# Altium footprint library Wurth_Elektronik_Electromechanic_Wire_to_Board_Connectors_rev16a.PCBLIB: 662 footprints (part 28 of 42)
Each footprint in its own frame and in the unit in brackets; x right, y up, seen from the top. Pads: shape width x height; smd on the part's side, far side on the other; paste and mask are expansions set on the pad; w line width, h text height; cw(c..) or ccw(c..) is an arc to the next point about the centre after c.
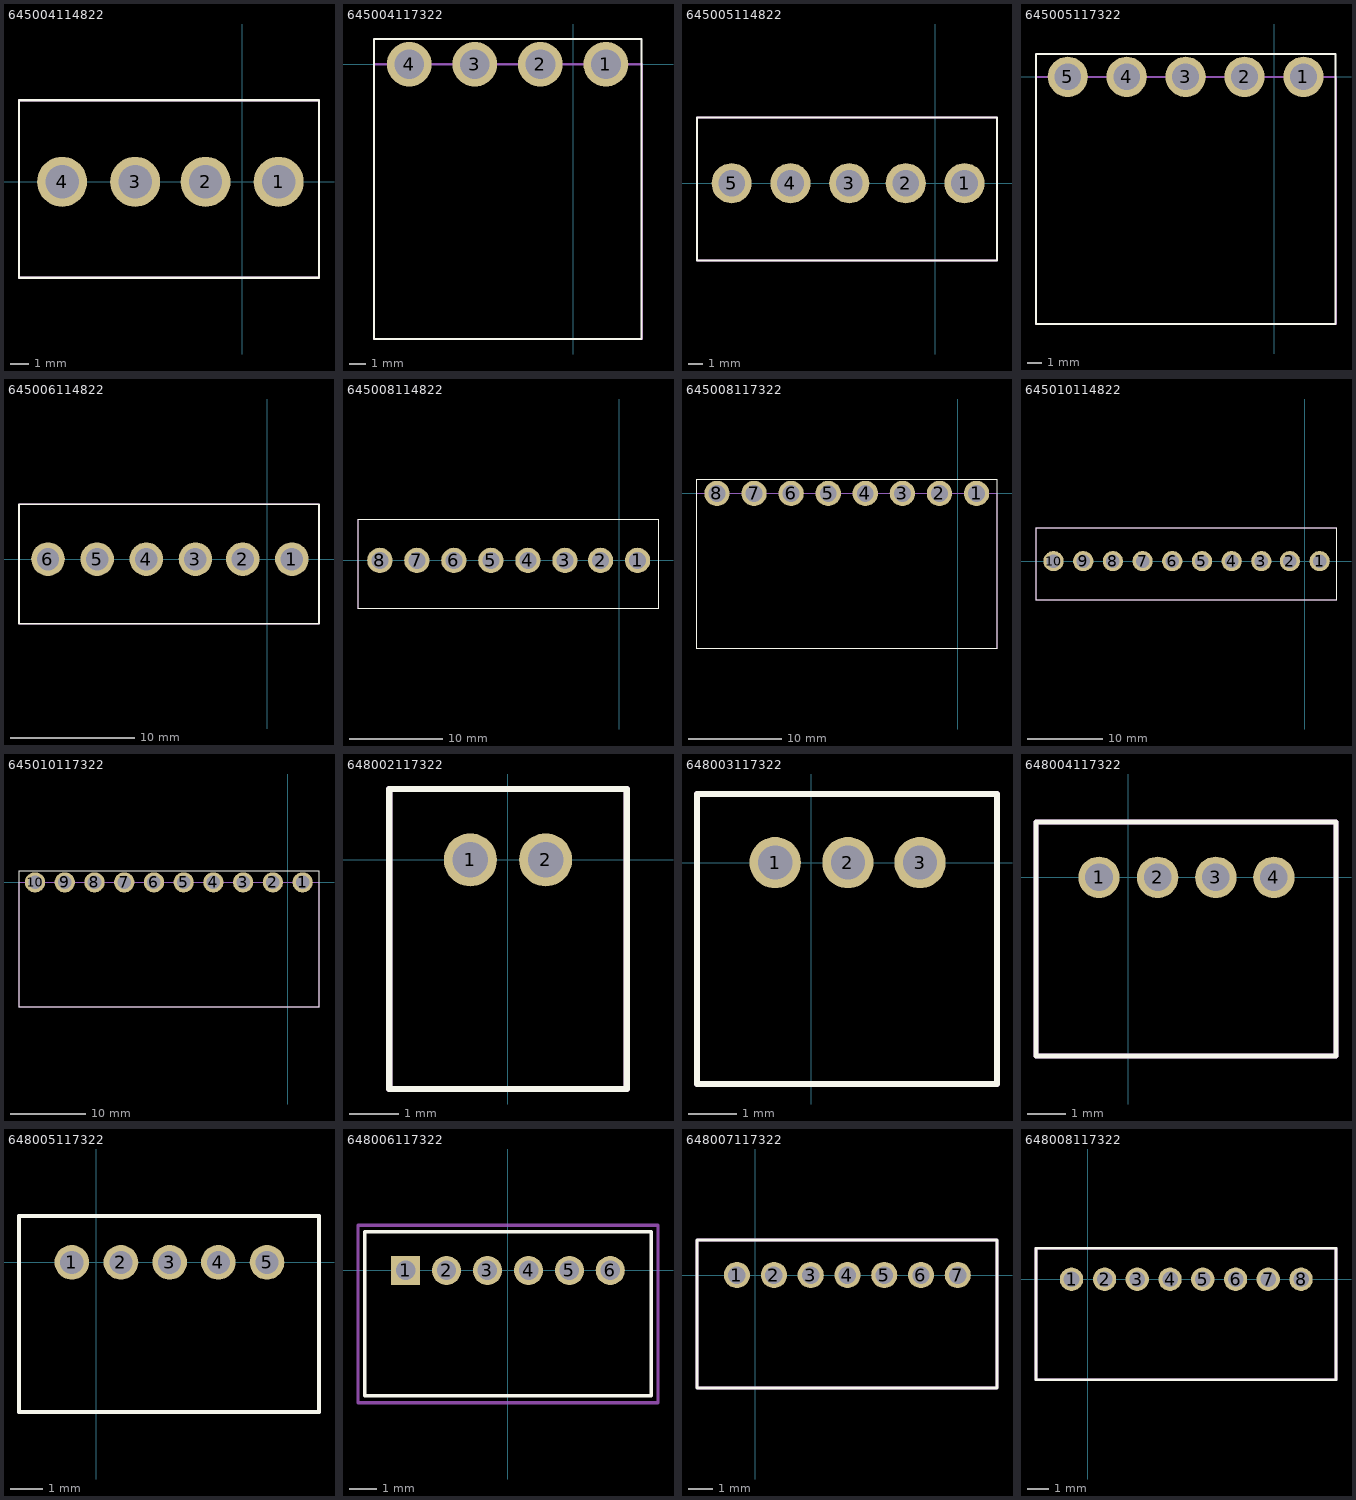
[diagram p27: the footprints below, top view; thin cyan lines are the x and y axes]

## 645004114822 [mil]
pads (4):
  round 106.5 hole 71: 1(78,0) 2(-77.95,0) 3(-227.95,0) 4(-383.86,0)
Top Overlay:
  lines w5: -475.79,-204.72 164,-204.72 164,174 -475.79,174 -475.79,-204.72
Mechanical 2:
  text ">NAME" at 225,0 h77.5
Mechanical 4:
  text ">VALUE" at 234,-77.95 h77.5
Mechanical 16:
  lines w5: -475.79,-204.72 -475.79,174 164,174 164,-204.72 -475.79,-204.72
  text "1" at 50,-25 h77.5
  text "4" at -405.91,-25 h77.5

## 645004117322 [mil]
pads (4):
  round 106.5 hole 71: 1(78,0) 2(-77.95,0) 3(-233.86,0) 4(-389.76,0)
Top Overlay:
  lines w5: -473.82,-653.54 163,-653.54 163,60 -473.82,60 -473.82,-653.54
Mechanical 2:
  text ">NAME" at 225,0 h77.5
Mechanical 4:
  text ">VALUE" at 234,-77.95 h77.5
Mechanical 16:
  lines w5: -473.82,-653.54 -473.82,0 164,0 164,-653.54 -473.82,-653.54
  text "1" at 50,-25 h77.5
  text "4" at -411.81,-25 h77.5

## 645005114822 [mil]
pads (5):
  round 106.5 hole 71: 1(78,0) 2(-77.95,0) 3(-227.95,0) 4(-383.86,0) 5(-539.76,0)
Top Overlay:
  lines w5: -631.69,-204.72 164,-204.72 164,174 -631.69,174 -631.69,-204.72
Mechanical 2:
  text ">NAME" at 225,0 h77.5
Mechanical 4:
  text ">VALUE" at 234,-77.95 h77.5
Mechanical 16:
  lines w5: -631.69,-204.72 -631.69,174 164,174 164,-204.72 -631.69,-204.72
  text "1" at 50,-25 h77.5
  text "5" at -561.81,-25 h77.5

## 645005117322 [mil]
pads (5):
  round 106.5 hole 71: 1(78,0) 2(-77.95,0) 3(-233.86,0) 4(-389.76,0) 5(-545.67,0)
Top Overlay:
  lines w5: -629.72,-653.54 163,-653.54 163,60 -629.72,60 -629.72,-653.54
Mechanical 2:
  text ">NAME" at 225,0 h77.5
Mechanical 4:
  text ">VALUE" at 234,-77.95 h77.5
Mechanical 16:
  lines w5: -629.72,-653.54 -629.72,0 164,0 164,-653.54 -629.72,-653.54
  text "1" at 50,-25 h77.5
  text "5" at -567.72,-25 h77.5

## 645006114822 [mil]
pads (6):
  round 106.5 hole 71: 1(78,0) 2(-77.95,0) 3(-227.95,0) 4(-383.86,0) 5(-539.76,0) 6(-695.67,0)
Top Overlay:
  lines w5: -787.6,-204.72 164,-204.72 164,174 -787.6,174 -787.6,-204.72
Mechanical 2:
  text ">NAME" at 225,0 h77.5
Mechanical 4:
  text ">VALUE" at 234,-77.95 h77.5
Mechanical 16:
  lines w5: -787.6,-204.72 -787.6,174 164,174 164,-204.72 -787.6,-204.72
  text "1" at 50,-25 h77.5
  text "6" at -717.72,-25 h77.5

## 645008114822 [mil]
pads (8):
  round 106.5 hole 71: 1(78,0) 2(-77.95,0) 3(-227.95,0) 4(-383.86,0) 5(-539.76,0) 6(-695.67,0) 7(-851.57,0) 8(-1007.48,0)
Top Overlay:
  lines w5: -1099.41,-204.72 164,-204.72 164,174 -1099.41,174 -1099.41,-204.72
Mechanical 2:
  text ">NAME" at 225,0 h77.5
Mechanical 4:
  text ">VALUE" at 234,-77.95 h77.5
Mechanical 16:
  lines w5: -1099.41,-204.72 -1099.41,174 164,174 164,-204.72 -1099.41,-204.72
  text "1" at 50,-25 h77.5
  text "8" at -1029.53,-25 h77.5

## 645008117322 [mil]
pads (8):
  round 106.5 hole 71: 1(78,0) 2(-77.95,0) 3(-233.86,0) 4(-389.76,0) 5(-545.67,0) 6(-701.57,0) 7(-857.48,0) 8(-1013.39,0)
Top Overlay:
  lines w5: -1097.44,-653.54 163,-653.54 163,60 -1097.44,60 -1097.44,-653.54
Mechanical 2:
  text ">NAME" at 225,0 h77.5
Mechanical 4:
  text ">VALUE" at 234,-77.95 h77.5
Mechanical 16:
  lines w5: -1097.44,-653.54 -1097.44,0 164,0 164,-653.54 -1097.44,-653.54
  text "1" at 50,-25 h77.5
  text "8" at -1033.07,-25 h77.5

## 645010114822 [mil]
pads (10):
  round 106.5 hole 71: 1(78,0) 2(-77.95,0) 3(-227.95,0) 4(-383.86,0) 5(-539.76,0) 6(-695.67,0) 7(-851.57,0) 8(-1007.48,0) 9(-1163.39,0) 10(-1319.29,0)
Top Overlay:
  lines w5: -1411.22,-204.72 164,-204.72 164,174 -1411.22,174 -1411.22,-204.72
Mechanical 2:
  text ">NAME" at 225,0 h77.5
Mechanical 4:
  text ">VALUE" at 234,-77.95 h77.5
Mechanical 16:
  lines w5: -1411.22,-204.72 -1411.22,174 164,174 164,-204.72 -1411.22,-204.72
  text "1" at 50,-25 h77.5
  text "10" at -1341.34,-25 h77.5

## 645010117322 [mil]
pads (10):
  round 106.5 hole 71: 1(78,0) 2(-77.95,0) 3(-233.86,0) 4(-389.76,0) 5(-545.67,0) 6(-701.57,0) 7(-857.48,0) 8(-1013.39,0) 9(-1169.29,0) 10(-1325.2,0)
Top Overlay:
  lines w5: -1409.25,-653.54 163,-653.54 163,60 -1409.25,60 -1409.25,-653.54
Mechanical 2:
  text ">NAME" at 225,0 h77.5
Mechanical 4:
  text ">VALUE" at 234,-77.95 h77.5
Mechanical 16:
  lines w5: -1409.25,-653.54 -1409.25,0 164,0 164,-653.54 -1409.25,-653.54
  text "1" at 50,-25 h77.5
  text "10" at -1347.24,-25 h77.5

## 648002117322 [mil]
pads (2):
  round 42 hole 28: 1(-29.53,0) 2(30,0)
Top Overlay:
  lines w5: -93.5,-181.1 -93.5,56 94,56 94,-181.1 -93.5,-181.1
Mechanical 2:
  text ">NAME" at 117,-29.53 h77.5
Mechanical 4:
  text ">VALUE" at 117,-88.58 h77.5
Mechanical 16:
  lines w5: -93.5,-181.1 94,-181.1 94,56 -93.5,56 -93.5,-181.1
  text "1" at -44.29,-29.53 h77.5
  text "2" at 15,-29.53 h77.5

## 648003117322 [mil]
pads (3):
  round 42 hole 28: 1(-29.53,0) 2(30,0) 3(89,0)
Top Overlay:
  lines w5: -93.5,-181.1 -93.5,56 152,56 152,-181.1 -93.5,-181.1
Mechanical 2:
  text ">NAME" at 217,-29.53 h77.5
Mechanical 4:
  text ">VALUE" at 217,-88.58 h77.5
Mechanical 16:
  lines w5: -93.5,-181.1 152,-181.1 152,56 -93.5,56 -93.5,-181.1
  text "1" at -44.29,-29.53 h77.5
  text "3" at 74,-29.53 h77.5

## 648004117322 [mil]
pads (4):
  round 42 hole 28: 1(-29.53,0) 2(30,0) 3(89,0) 4(148,0)
Top Overlay:
  lines w5: -93.5,-181.1 -93.5,56 211,56 211,-181.1 -93.5,-181.1
Mechanical 2:
  text ">NAME" at 267,-29.53 h77.5
Mechanical 4:
  text ">VALUE" at 267,-88.58 h77.5
Mechanical 16:
  lines w5: -93.5,-181.1 211,-181.1 211,56 -93.5,56 -93.5,-181.1
  text "1" at -44.29,-29.53 h77.5
  text "4" at 133,-29.53 h77.5

## 648005117322 [mil]
pads (5):
  round 42 hole 28: 1(-29.53,0) 2(30,0) 3(89,0) 4(148,0) 5(207,0)
Top Overlay:
  lines w5: -93.5,-181.1 -93.5,56 270,56 270,-181.1 -93.5,-181.1
Mechanical 2:
  text ">NAME" at 317,-29.53 h77.5
Mechanical 4:
  text ">VALUE" at 317,-88.58 h77.5
Mechanical 16:
  lines w5: -93.5,-181.1 270,-181.1 270,56 -93.5,56 -93.5,-181.1
  text "1" at -44.29,-29.53 h77.5
  text "5" at 192,-29.53 h77.5

## 648006117322 [mil]
pads (6):
  rect 42x42 hole 28: 1(-147.64,0)
  round 42 hole 28: 2(-88.58,0) 3(-29.53,0) 4(30,0) 5(89,0) 6(148,0)
Top Overlay:
  lines w5: -206.69,-181.1 -206.69,56 207,56 207,-181.1 -206.69,-181.1
Mechanical 2:
  text ">NAME" at -206.69,76 h77.5
Mechanical 4:
  text ">VALUE" at -206.69,-251.1 h77.5
Mechanical 27:
  lines w5: -216.54,-190.94 -216.54,65 217,65 217,-190.94 -216.54,-190.94

## 648007117322 [mil]
pads (7):
  round 42 hole 28: 1(-29.53,0) 2(30,0) 3(89,0) 4(148,0) 5(207,0) 6(266,0) 7(325,0)
Top Overlay:
  lines w5: -93.5,-181.1 -93.5,56 388,56 388,-181.1 -93.5,-181.1
Mechanical 2:
  text ">NAME" at 467,-29.53 h77.5
Mechanical 4:
  text ">VALUE" at 467,-88.58 h77.5
Mechanical 16:
  lines w5: -93.5,-181.1 388,-181.1 388,56 -93.5,56 -93.5,-181.1
  text "1" at -44.29,-29.53 h77.5
  text "7" at 311,-29.53 h77.5

## 648008117322 [mil]
pads (8):
  round 42 hole 28: 1(-29.53,0) 2(30,0) 3(89,0) 4(148,0) 5(207,0) 6(266,0) 7(325,0) 8(384,0)
Top Overlay:
  lines w5: -93.5,-181.1 -93.5,56 447,56 447,-181.1 -93.5,-181.1
Mechanical 2:
  text ">NAME" at 517,-29.53 h77.5
Mechanical 4:
  text ">VALUE" at 517,-88.58 h77.5
Mechanical 16:
  lines w5: -93.5,-181.1 447,-181.1 447,56 -93.5,56 -93.5,-181.1
  text "1" at -44.29,-29.53 h77.5
  text "8" at 370,-29.53 h77.5